# Altium footprint library Belle_library.PcbLib: 59 footprints (part 1 of 4)
Each footprint in its own frame and in the unit in brackets; x right, y up, seen from the top. Pads: shape width x height; smd on the part's side, far side on the other; paste and mask are expansions set on the pad; w line width, h text height; cw(c..) or ccw(c..) is an arc to the next point about the centre after c.
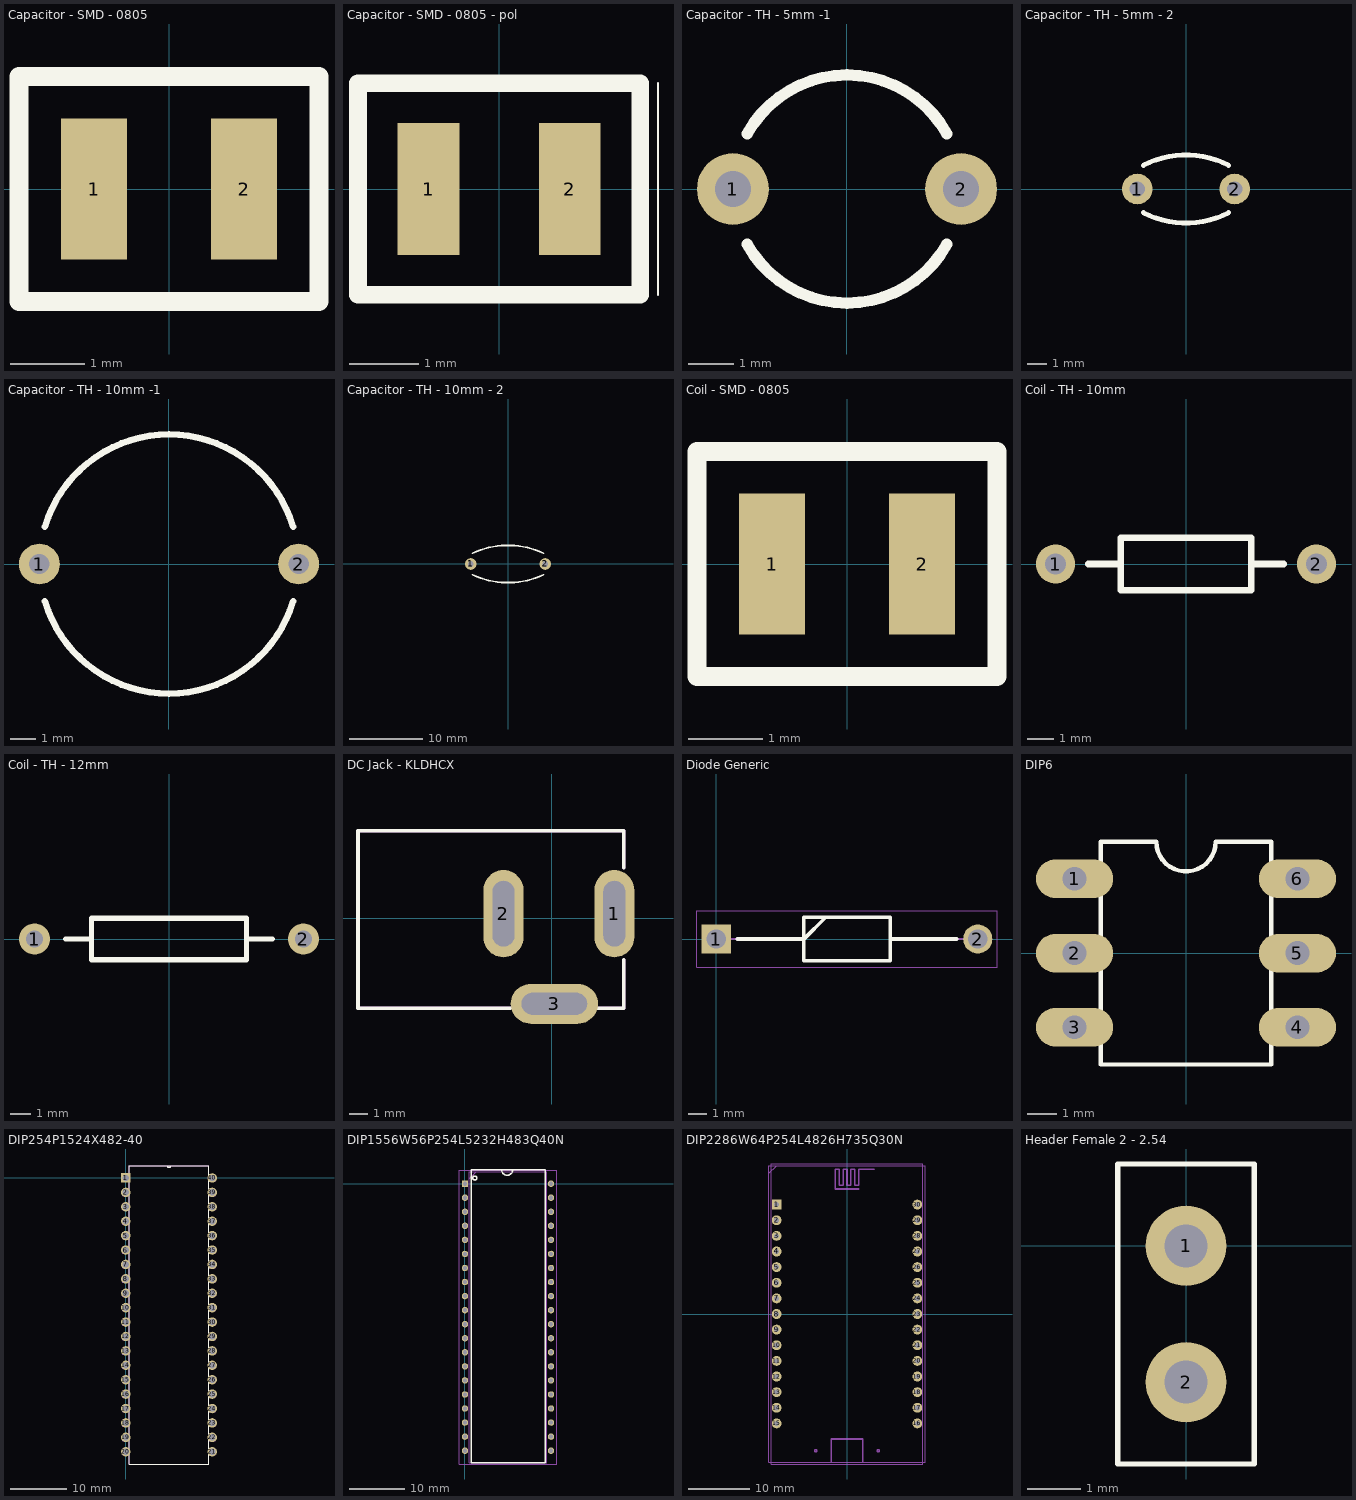
[diagram p0: the footprints below, top view; thin cyan lines are the x and y axes]

## Capacitor - SMD - 0805 [mil] "SMD capacitor - 0805"
pads (2):
  rect 35x75 smd: 1(-40,0) 2(40,0)
Top Overlay:
  lines w10: -80,-60 -80,60 80,60 80,-60 -80,-60
3D body "C0805B.STEP": height 32.5, standoff 1, extent -39.36,-24.6 39.38,24.61

## Capacitor - SMD - 0805 - pol [mil] "SMD capacitor - 0805"
pads (2):
  rect 35x75 smd: 1(-40,0) 2(40,0)
Top Overlay:
  lines w1: 90,-60 90,60
  lines w10: -80,-60 -80,60 80,60 80,-60 -80,-60
3D body "C0805B.STEP": height 32.5, standoff 1, extent -39.36,-24.6 39.38,24.61

## Capacitor - TH - 5mm -1 [mm] "Through-Hole Cirular Capacitor - 5mm"
pads (2):
  round 1.6 hole 0.8: 1(-2.54,0) 2(2.54,0)
Top Overlay:
  lines w0.254: -2.22,-1.234 ccw(c0,0) 2.22,-1.234 ; -2.22,1.234 cw(c0,0) 2.22,1.234

## Capacitor - TH - 5mm - 2 [mm] "Through-Hole Oval Capacitor - 5mm"
pads (2):
  round 1.6 hole 0.8: 1(-2.54,0) 2(2.54,0)
Top Overlay:
  lines w0.254: -2.22,-1.234 ccw(c0,3.022) 2.22,-1.234 ; -2.22,1.234 cw(c0,-3.022) 2.22,1.234

## Capacitor - TH - 10mm -1 [mm] "Through-Hole Cirular Capacitor - 10mm"
pads (2):
  round 1.6 hole 0.8: 1(-5.08,0) 2(5.08,0)
Top Overlay:
  lines w0.254: -4.866,-1.46 ccw(c0,0) 4.866,-1.46 ; -4.866,1.46 cw(c0,0) 4.866,1.46

## Capacitor - TH - 10mm - 2 [mm] "Through-Hole Oval Capacitor - 10mm"
pads (2):
  round 1.6 hole 0.8: 1(-5.08,0) 2(5.08,0)
Top Overlay:
  lines w0.254: -4.866,-1.46 ccw(c0,8.958) 4.866,-1.46 ; -4.866,1.46 cw(c0,-8.958) 4.866,1.46

## Coil - SMD - 0805 [mil] "SMD coil - 0805"
pads (2):
  rect 35x75 smd: 1(-40,0) 2(40,0)
Top Overlay:
  lines w10: -80,-60 -80,60 80,60 80,-60 -80,-60
3D body "ferrite_bead_0805.STEP": height 35.43, standoff 0, extent -39.37,-23.24 39.37,24

## Coil - TH - 10mm [mm] "Through-hole coild 10mm/0.8mm"
pads (2):
  round 1.5 hole 0.8: 1(-5,0) 2(5,0)
Top Overlay:
  lines w0.254: -3.75,0 -2.5,0 ; 3.75,0 2.5,0 ; -2.5,0 -2.5,1 2.5,1 2.5,0 ; -2.5,0 -2.5,-1 2.5,-1 2.5,0
3D body "RES_AL_060W_500P.STEP": height 3.9, standoff -1.3, extent -6.55,-1.2 6.55,1.2

## Coil - TH - 12mm [mm] "Through-hole coil 12mm/0.8mm"
pads (2):
  round 1.5 hole 0.8: 1(-6.5,0) 2(6.5,0)
Top Overlay:
  lines w0.254: -5,0 -3.75,0 ; 3.75,0 5,0 ; -3.75,0 -3.75,1 3.75,1 3.75,-1 -3.75,-1 -3.75,0
3D body "RES_AL_060W_500P.STEP": height 3.9, standoff -1.3, extent -6.55,-1.2 6.55,1.2

## DC Jack - KLDHCX [mm]
pads (3):
  oval 2.2x4.8 hole 1.2 slot 3.6 at 90 deg: 1(3.429,0.254) 2(-2.667,0.254)
  oval 4.8x2.2 hole 1.2 slot 3.6 at 0 deg: 3(0.127,-4.699)
Top Overlay:
  lines w0.2: -2.286,-4.953 -10.668,-4.953 -10.668,4.826 3.937,4.826 3.937,2.794 ; 2.413,-4.953 3.937,-4.953 3.937,-2.286
Mechanical 13:
  lines w0.2: -2.286,-4.953 -10.668,-4.953 -10.668,4.826 3.937,4.826 3.937,2.794 ; 2.413,-4.953 3.937,-4.953 3.937,-2.286
3D body "DC Power Jack 2mm Pin.STEP": height 11, standoff -5.1, extent -10.649,-4.896 3.851,4.904

## Diode Generic [mm]
pads (2):
  rect 1.575x1.575 hole 1.05: 1(0,0)
  round 1.575 hole 1.05: 2(14.1,0)
Top Overlay:
  lines w0.2: 1.138,0 4.725,0 5.9,1.175 ; 9.375,0 12.962,0 ; 4.725,-1.175 9.375,-1.175 9.375,1.175 4.725,1.175 4.725,-1.175
Mechanical 13:
  lines w0.1: 0,0 4.725,0 5.9,1.175 ; 9.375,0 14.1,0 ; 4.725,-1.175 9.375,-1.175 9.375,1.175 4.725,1.175 4.725,-1.175
Mechanical 15:
  lines w0.05: -1.038,-1.525 15.137,-1.525 15.137,1.525 -1.038,1.525 -1.038,-1.525
3D body "1N4007.stp": height 2.69, standoff -2.7, extent -0.427,-1.347 14.48,1.347

## DIP6 [mil]
pads (6):
  oval 104x52 hole 32: 1(-150,100) 2(-150,0) 3(-150,-100) 4(150,-100) 5(150,0) 6(150,100)
Top Overlay:
  lines w6: -115,-150 -115,150 -40,150 ccw(c0,150) 40,150 115,150 115,-150 -115,-150
3D body "DIP6.STEP": height 185.04, standoff -102.36, extent -154.92,-142.92 154.92,142.91

## DIP254P1524X482-40 [mil]
pads (40):
  rect 66x66 hole 44: 1(0,0)
  round 66 hole 44: 2(0,-100) 3(0,-200) 4(0,-300) 5(0,-400) 6(0,-500) 7(0,-600) 8(0,-700) 9(0,-800) 10(0,-900) 11(0,-1000) 12(0,-1100) 13(0,-1200) 14(0,-1300) 15(0,-1400) 16(0,-1500) 17(0,-1600) 18(0,-1700) 19(0,-1800) 20(0,-1900) 21(600,-1900) 22(600,-1800) 23(600,-1700) 24(600,-1600) 25(600,-1500) 26(600,-1400) 27(600,-1300) 28(600,-1200) 29(600,-1100) 30(600,-1000) 31(600,-900) 32(600,-800) 33(600,-700) 34(600,-600) 35(600,-500) 36(600,-400) 37(600,-300) 38(600,-200) 39(600,-100) 40(600,0)
Top Overlay:
  lines w6: 288,85 ccw(c300,85) 312,85 ; 288,85 25,85 25,-1985 575,-1985 575,85 312,85 ; 288,85 312,85
Mechanical 13:
  drawing of 167 lines, arcs and shapes, not listed

## DIP1556W56P254L5232H483Q40N [mil]
pads (40):
  rect 45.63x45.63 hole 29.88: 1(0,0)
  round 45.63 hole 29.88: 2(0,-100) 3(0,-200) 4(0,-300) 5(0,-400) 6(0,-500) 7(0,-600) 8(0,-700) 9(0,-800) 10(0,-900) 11(0,-1000) 12(0,-1100) 13(0,-1200) 14(0,-1300) 15(0,-1400) 16(0,-1500) 17(0,-1600) 18(0,-1700) 19(0,-1800) 20(0,-1900) 21(612.52,-1900) 22(612.52,-1800) 23(612.52,-1700) 24(612.52,-1600) 25(612.52,-1500) 26(612.52,-1400) 27(612.52,-1300) 28(612.52,-1200) 29(612.52,-1100) 30(612.52,-1000) 31(612.52,-900) 32(612.52,-800) 33(612.52,-700) 34(612.52,-600) 35(612.52,-500) 36(612.52,-400) 37(612.52,-300) 38(612.52,-200) 39(612.52,-100) 40(612.52,0)
Top Overlay:
  circle w10: c70,40 r14.14
  lines w10: 260,100 ccw(c300,100) 340,100 ; 45,-1985 45,100 570,100 570,-1985 45,-1985
Mechanical 13:
  lines w3.94: 31.26,35 81.26,85 ; 31.26,-1985 581.26,-1985 581.26,85 31.26,85 31.26,-1985
Mechanical 15:
  lines w1.97: -38.9,-1994.84 651.42,-1994.84 651.42,94.84 -38.9,94.84 -38.9,-1994.84
3D body "ATMEGA32-16PU.stp": height 190, standoff -137.8, extent -5.49,-1980 618.01,80

## DIP2286W64P254L4826H735Q30N [mm]
pads (30):
  rect 1.6x1.6 hole 0.835: 1(-11.43,17.78)
  round 1.6 hole 0.835: 2(-11.43,15.24) 3(-11.43,12.7) 4(-11.43,10.16) 5(-11.43,7.62) 6(-11.43,5.08) 7(-11.43,2.54) 8(-11.43,0) 9(-11.43,-2.54) 10(-11.43,-5.08) 11(-11.43,-7.62) 12(-11.43,-10.16) 13(-11.43,-12.7) 14(-11.43,-15.24) 15(-11.43,-17.78) 16(11.43,-17.78) 17(11.43,-15.24) 18(11.43,-12.7) 19(11.43,-10.16) 20(11.43,-7.62) 21(11.43,-5.08) 22(11.43,-2.54) 23(11.43,0) 24(11.43,2.54) 25(11.43,5.08) 26(11.43,7.62) 27(11.43,10.16) 28(11.43,12.7) 29(11.43,15.24) 30(11.43,17.78)
Mechanical 1:
  circle w0.254: c5.08,-22.225 r0.18
  circle w0.254: c-5.08,-22.225 r0.18
  lines w0.2: -12.7,-24.13 12.7,-24.13 ; -12.048,24.13 12.7,24.13
  lines w0.254: -2.54,-24.13 -2.54,-20.32 2.54,-20.32 2.54,-24.13 ; 1.905,20.32 -1.905,20.32 -1.905,23.495 -1.27,23.495 -1.27,20.955 -0.635,20.955 -0.635,23.495 0,23.495 0,20.955 0.635,20.955 0.635,23.495 1.27,23.495 1.27,20.955 1.905,20.955 1.905,23.495 4.445,23.495
Mechanical 13:
  lines w0.1: -12.7,22.86 -11.43,24.13 ; -12.7,-24.13 12.7,-24.13 12.7,24.13 -12.7,24.13 -12.7,-24.13
Mechanical 15:
  lines w0.05: -12.298,-24.38 12.298,-24.38 12.298,24.38 -12.298,24.38 -12.298,-24.38
3D body "ESP8266 v7.stp": height 12.85, standoff -1.24, extent -12.7,-24.252 12.85,24.568

## Header Female 2 - 2.54 [mm] "header - 2 pin - pitch 2.54mm"
pads (2):
  round 1.5 hole 0.8: 1(0,0) 2(0,-2.54)
Top Overlay:
  lines w0.1: -1.27,-4.064 1.27,-4.064 1.27,1.524 -1.27,1.524 -1.27,-4.064
3D body "2-Pin Header - Female - 2.54mm.step": height 5, standoff -3, extent -1.25,-4.06 1.25,1.52